# Altium footprint library LED.PcbLib: 71 footprints (part 1 of 5)
Each footprint in its own frame and in the unit in brackets; x right, y up, seen from the top. Pads: shape width x height; smd on the part's side, far side on the other; paste and mask are expansions set on the pad; w line width, h text height; cw(c..) or ccw(c..) is an arc to the next point about the centre after c.
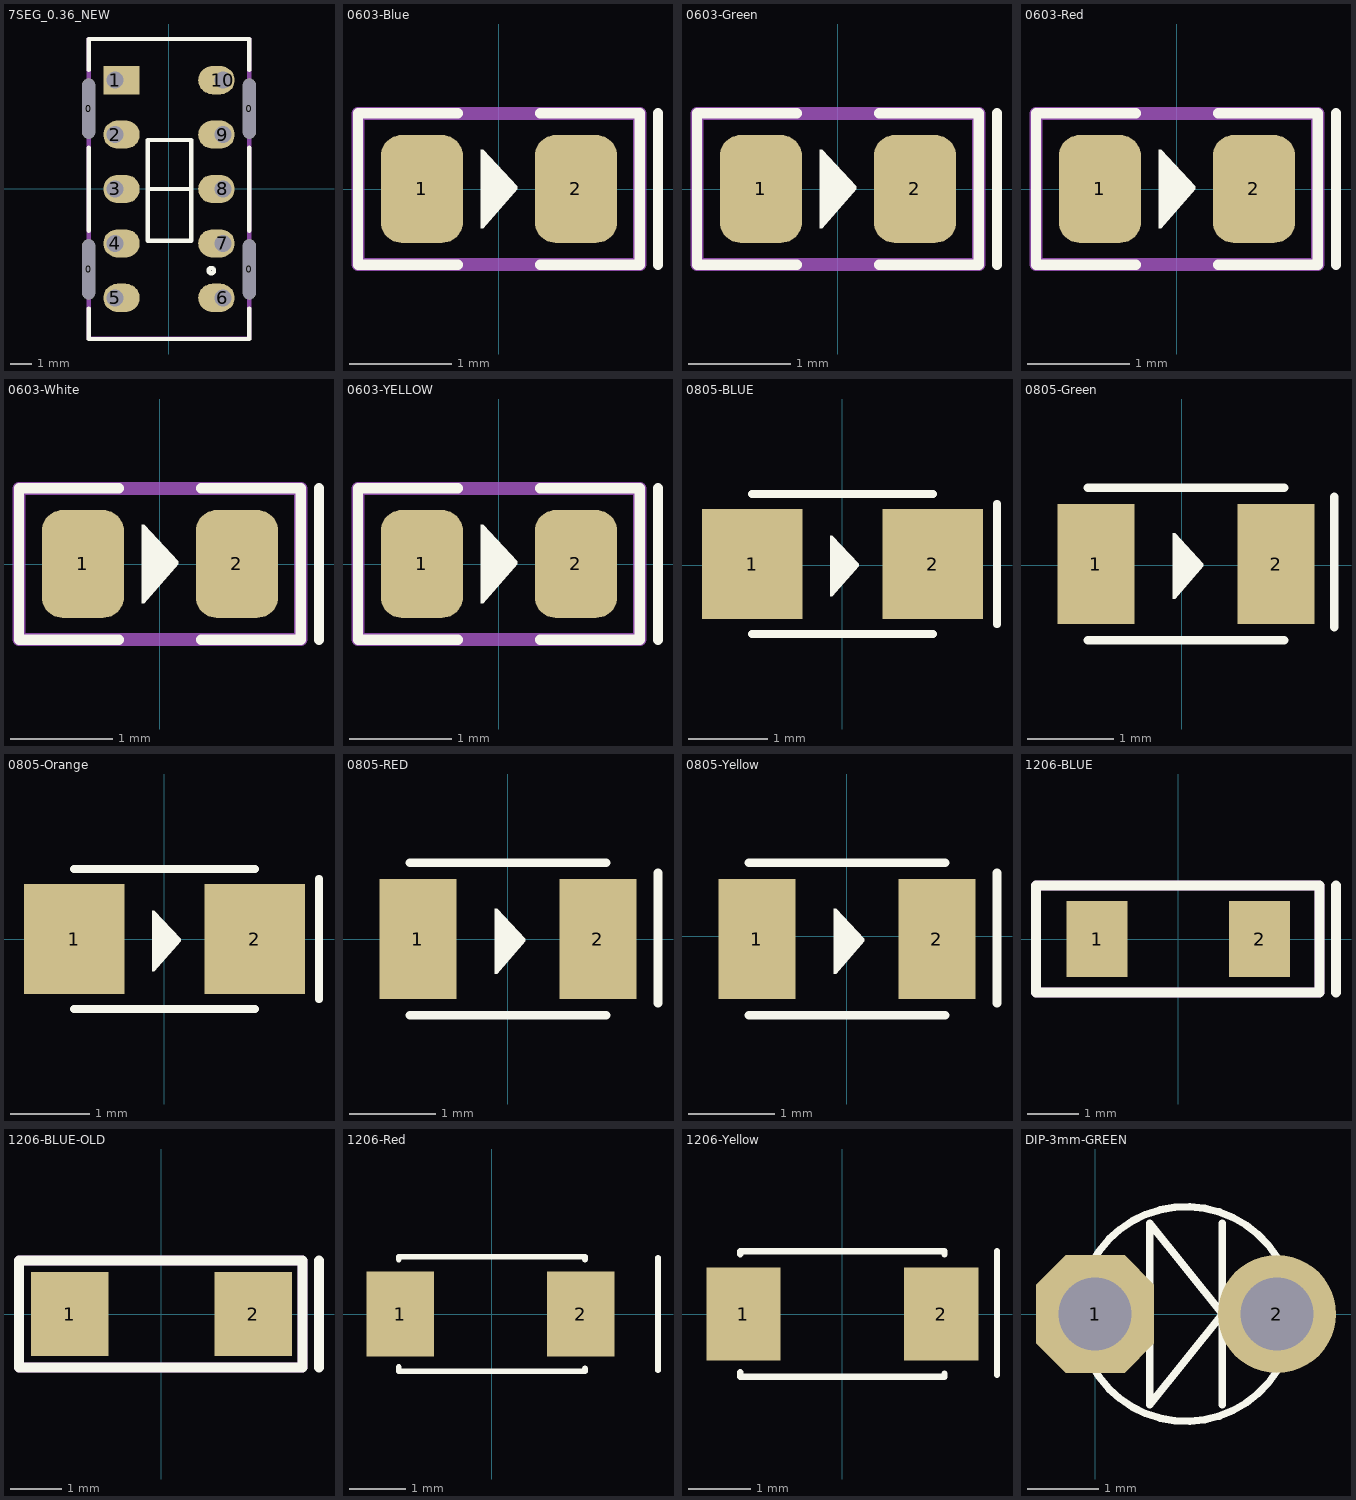
[diagram p0: the footprints below, top view; thin cyan lines are the x and y axes]

## 7SEG_0.36_NEW [mm] "led 7 - 0.36 - 10 pin"
height 8
pads (14):
  oval 0.6x2.8 hole 0.6 slot 2.8 at 90 deg unplated: 0(-3.75,-3.75) 0(-3.75,3.75) 0(3.75,-3.75) 0(3.75,3.75)
  rect 1.7x1.32 hole 0.8 copper offset 0.3,0: 1(-2.515,5.08)
  oval 1.7x1.32 hole 0.8 copper offset 0.3,0: 2(-2.515,2.54) 3(-2.515,0) 4(-2.515,-2.54) 5(-2.515,-5.08)
  oval 1.7x1.32 hole 0.8 copper offset -0.3,0: 6(2.515,-5.08) 7(2.515,-2.54) 8(2.515,0) 9(2.515,2.54) 10(2.515,5.08)
Top Overlay:
  circle w0.2: c1.972,-3.81 r0.127
  lines w0.2: -3.75,-5.575 -3.75,-7 ; -3.75,-1.95 -3.75,1.925 ; -3.75,5.55 -3.75,7 3.75,7 ; -0.991,0 1.041,0 ; 3.75,-5.575 3.75,-7 -3.75,-7 ; 3.75,-1.95 3.75,1.925 ; 3.75,5.55 3.75,7 ; -3.75,-7 -3.75,-7 ; 3.75,7 3.75,7 ; -0.991,-2.413 1.041,-2.413 1.041,2.286 -0.991,2.286 -0.991,-2.413
Mechanical 13:
  lines w0.2: -3.75,-6.975 3.75,-6.975 3.75,7 -3.75,7 -3.75,-6.975
3D body "SW3dPS-Disp_SA36-11.STEP": height 7.58, standoff -4.92, extent -3.75,-7 3.75,7

## 0603-Blue [mm]
pads (2):
  rrect50% 0.8x1.05 smd: 1(-0.75,0) 2(0.75,0)
Top Overlay:
  region: -0.178,0.381 -0.152,0.381 0.178,0.025 0.178,0 -0.152,-0.381 -0.178,-0.381
  lines w0.1: -0.4,-0.737 -1.372,-0.737 -1.372,0.737 -0.4,0.737 ; 0.4,-0.737 1.372,-0.737 1.372,0.737 0.4,0.737 ; 1.549,-0.737 1.549,0.737
Mechanical 13:
  lines w0.127: -1.371,-0.736 -1.371,0.737 1.372,0.737 1.372,-0.736 -1.371,-0.736
  text ".Designator" at -1.41,-0.21 h0.8
Mechanical 15:
  lines w0.127: -1.371,-0.736 -1.371,0.737 1.372,0.737 1.372,-0.736 -1.371,-0.736
  text ".Comment" at -1.4,-0.19 h0.8
3D body "User Library-LTST-C190TBKT.STEP": height 0.9, standoff 0, extent -0.85,-0.45 0.85,0.45

## 0603-Green [mm]
pads (2):
  rrect50% 0.8x1.05 smd: 1(-0.75,0) 2(0.75,0)
Top Overlay:
  region: -0.178,0.381 -0.152,0.381 0.178,0.025 0.178,0 -0.152,-0.381 -0.178,-0.381
  lines w0.1: -0.4,-0.737 -1.372,-0.737 -1.372,0.737 -0.4,0.737 ; 0.4,-0.737 1.372,-0.737 1.372,0.737 0.4,0.737 ; 1.549,-0.737 1.549,0.737
Mechanical 13:
  lines w0.127: -1.371,-0.736 1.372,-0.736 1.372,0.737 -1.371,0.737 -1.371,-0.736
  text ".Designator" at -1.41,-0.21 h0.8
Mechanical 15:
  lines w0.127: -1.371,-0.736 1.372,-0.736 1.372,0.737 -1.371,0.737 -1.371,-0.736
  text ".Comment" at -1.4,-0.19 h0.8
3D body "User Library-LED_0603_G.STEP": height 0.6, standoff 0, extent -0.8,-0.4 0.8,0.4

## 0603-Red [mm]
pads (2):
  rrect50% 0.8x1.05 smd: 1(-0.75,0) 2(0.75,0)
Top Overlay:
  region: -0.178,0.381 -0.152,0.381 0.178,0.025 0.178,0 -0.152,-0.381 -0.178,-0.381
  lines w0.1: -0.4,-0.737 -1.372,-0.737 -1.372,0.737 -0.4,0.737 ; 0.4,-0.737 1.372,-0.737 1.372,0.737 0.4,0.737 ; 1.549,-0.737 1.549,0.737
Mechanical 13:
  lines w0.127: -1.371,-0.736 1.372,-0.736 1.372,0.737 -1.371,0.737 -1.371,-0.736
  text ".Designator" at -1.41,-0.21 h0.8
Mechanical 15:
  lines w0.127: -1.371,-0.736 1.372,-0.736 1.372,0.737 -1.371,0.737 -1.371,-0.736
  text ".Comment" at -1.4,-0.19 h0.8
3D body "User Library-LED_0603_R.STEP": height 0.6, standoff 0, extent -0.762,-0.381 0.838,0.419

## 0603-White [mm]
pads (2):
  rrect50% 0.8x1.05 smd: 1(-0.75,0) 2(0.75,0)
Top Overlay:
  region: -0.178,0.381 -0.152,0.381 0.178,0.025 0.178,0 -0.152,-0.381 -0.178,-0.381
  lines w0.1: -0.4,-0.737 -1.372,-0.737 -1.372,0.737 -0.4,0.737 ; 0.4,-0.737 1.372,-0.737 1.372,0.737 0.4,0.737 ; 1.549,-0.737 1.549,0.737
Mechanical 13:
  lines w0.127: -1.371,-0.736 1.372,-0.736 1.372,0.737 -1.371,0.737 -1.371,-0.736
  text ".Designator" at -1.41,-0.21 h0.8
Mechanical 15:
  lines w0.127: -1.371,-0.736 1.372,-0.736 1.372,0.737 -1.371,0.737 -1.371,-0.736
  text ".Comment" at -1.4,-0.19 h0.8
3D body "ALSRobot-LED0603(R).step": height 0.6, standoff 0, extent -0.81,-0.425 0.81,0.375

## 0603-YELLOW [mm]
pads (2):
  rrect50% 0.8x1.05 smd: 1(-0.75,0) 2(0.75,0)
Top Overlay:
  region: -0.178,0.381 -0.152,0.381 0.178,0.025 0.178,0 -0.152,-0.381 -0.178,-0.381
  lines w0.1: -0.4,-0.737 -1.372,-0.737 -1.372,0.737 -0.4,0.737 ; 0.4,-0.737 1.372,-0.737 1.372,0.737 0.4,0.737 ; 1.549,-0.737 1.549,0.737
Mechanical 13:
  lines w0.127: -1.371,-0.736 1.372,-0.736 1.372,0.737 -1.371,0.737 -1.371,-0.736
  text ".Designator" at -1.41,-0.21 h0.8
Mechanical 15:
  lines w0.127: -1.371,-0.736 1.372,-0.736 1.372,0.737 -1.371,0.737 -1.371,-0.736
  text ".Comment" at -1.4,-0.19 h0.8
3D body "STEP-WL-SMCW-0603-rev1.stp": height 0.7, standoff 0, extent -0.8,-0.4 0.8,0.4

## 0805-BLUE [mil]
pads (2):
  rect 50x55 smd: 1(-45,0.5) 2(45,0.5)
Top Overlay:
  region: -6,14.5 -5,14.5 8,0.5 8,-0.5 -5,-15.5 -6,-15.5
  lines w3.94: 77,-29.5 77,30.5
  lines w4: -45,-34.5 45,-34.5 ; -45,35.5 45,35.5
3D body "User Library-led_0805-blue.step": height 43.31, standoff 0, extent -39.76,-24.1 39.77,25.11

## 0805-Green [mil]
pads (2):
  rect 35.43x55 smd: 1(-39.5,0.5) 2(43.18,0.5)
Top Overlay:
  region: -4.16,14.5 -3.16,14.5 9.84,0.5 9.84,-0.5 -3.16,-15.5 -4.16,-15.5
  lines w3.94: 69.88,-28.54 69.88,31.46
  lines w4: -43.16,-34.5 46.84,-34.5 ; -43.16,35.5 46.84,35.5
3D body "User Library-led_0805-Green.step": height 43.31, standoff 0, extent -36.35,-24.11 43.18,25.1

## 0805-Orange [mil]
pads (2):
  rect 50x55 smd: 1(-45,0) 2(45,0)
Top Overlay:
  region: -6,14 -5,14 8,0 8,-1 -5,-16 -6,-16
  lines w3.94: 77,-30 77,30
  lines w4: -45,-35 45,-35 ; -45,35 45,35
3D body "User Library-led_0805-orange.step": height 43.31, standoff 0, extent -39.76,-24.59 39.77,24.62

## 0805-RED [mm]
pads (2):
  rect 0.9x1.397 smd: 1(-1.05,0) 2(1.05,0)
Top Overlay:
  region: -0.152,0.356 -0.127,0.356 0.203,0 0.203,-0.025 -0.127,-0.406 -0.152,-0.406
  lines w0.1: 1.75,-0.75 1.75,0.774
  lines w0.102: -1.143,-0.889 1.143,-0.889 ; -1.143,0.889 1.143,0.889
3D body "User Library-led_0805-red.step": height 1.1, standoff 0, extent -1.01,-0.625 1.01,0.625

## 0805-Yellow [mm]
pads (2):
  rect 0.9x1.397 smd: 1(-1.05,-0.033) 2(1.05,-0.033)
Top Overlay:
  region: -0.152,0.323 -0.127,0.323 0.203,-0.032 0.203,-0.058 -0.127,-0.439 -0.152,-0.439
  lines w0.1: 1.75,-0.783 1.75,0.741
  lines w0.102: -1.143,-0.922 1.143,-0.922 ; -1.143,0.856 1.143,0.856
3D body "User Library-led_0805-yellow.step": height 1.1, standoff 0, extent -0.972,-0.65 1.048,0.6

## 1206-BLUE [mm]
pads (2):
  rect 1.2x1.5 smd: 1(-1.6,0) 2(1.6,0)
Top Overlay:
  lines w0.2: 3.1,-1.05 3.1,1.05 ; -2.8,-1.05 2.775,-1.05 2.775,1.05 -2.8,1.05 -2.8,-1.05
Mechanical 13:
  lines w0.2: -2.8,-1.05 -2.8,1.05 2.775,1.05 2.775,-1.05 -2.8,-1.05
  text ".Designator" at -2,-0.267 h1.5
3D body "User Library-led_1206-red.step": height 1.1, standoff 0, extent -1.61,-0.8 1.61,0.8
3D body: height 1.15, standoff 0.5, extent -1.05,-0.73 1.05,0.73

## 1206-BLUE-OLD [mil]
pads (2):
  rect 60x65 smd: 1(-71,0) 2(71,0)
Top Overlay:
  lines w7.87: 122.05,-41.34 122.05,41.34 ; -110.24,-41.34 109.25,-41.34 109.25,41.34 -110.24,41.34 -110.24,-41.34
Mechanical 13:
  lines w7.87: -110.24,-41.34 -110.24,41.34 109.25,41.34 109.25,-41.34 -110.24,-41.34
  text ".Designator" at -78.74,-10.52 h59.06
3D body "User Library-led_1206-red.step": height 43.31, standoff 0, extent -63.77,-30.31 63,32.69
3D body: height 45.28, standoff 19.68, extent -41.73,-27.56 40.95,29.92

## 1206-Red [mm]
pads (2):
  rect 1.2x1.5 smd: 1(-1.625,0) 2(1.575,0)
Top Overlay:
  lines w0.1: 2.947,-1 2.947,1
  lines w0.102: -1.651,-0.94 -1.651,-1.016 1.651,-1.016 1.651,-0.965 ; -1.651,0.965 -1.651,1.016 1.651,1.016 1.651,0.965
Mechanical 13:
  text ".Designator" at -1.241,-0.101 h0.38
Mechanical 15:
  text ".Comment" at -1.241,-0.101 h0.38
3D body "User Library-led_1206-red.step": height 1.1, standoff 0, extent -1.635,-0.8 1.585,0.8

## 1206-Yellow [mm]
pads (2):
  rect 1.2x1.5 smd: 1(-1.6,0) 2(1.6,0)
Top Overlay:
  lines w0.1: 2.5,-0.984 2.5,1.016
  lines w0.102: -1.651,-0.94 -1.651,-1.016 1.651,-1.016 1.651,-0.965 ; -1.651,0.965 -1.651,1.016 1.651,1.016 1.651,0.965
Mechanical 13:
  text ".Designator" at -1.25,-0.05 h0.38
Mechanical 15:
  text ".Comment" at -1.241,-0.101 h0.38
3D body: height 1.15, standoff 0.5, extent -1.05,-0.73 1.05,0.73
3D body "User Library-led_1206-red.step": height 1.1, standoff 0, extent -1.61,-0.8 1.61,0.8

## DIP-3mm-GREEN [mil]
pads (2):
  oct 65x65 hole 40: 1(0,0)
  round 65 hole 40: 2(100,0)
Top Overlay:
  circle w4: c50,0 r59.06
  lines w4: 70,-50 70,0 ; 70,50 70,0 ; 70,0 30,-50 30,50 70,0
3D body "User Library-LED_d3-GRN.STEP": height 182.09, standoff -112.2, extent -15,-69.86 111.51,59.95